# Altium footprint library HamedLib.PcbLib: 221 footprints (part 10 of 14)
Each footprint in its own frame and in the unit in brackets; x right, y up, seen from the top. Pads: shape width x height; smd on the part's side, far side on the other; paste and mask are expansions set on the pad; w line width, h text height; cw(c..) or ccw(c..) is an arc to the next point about the centre after c.
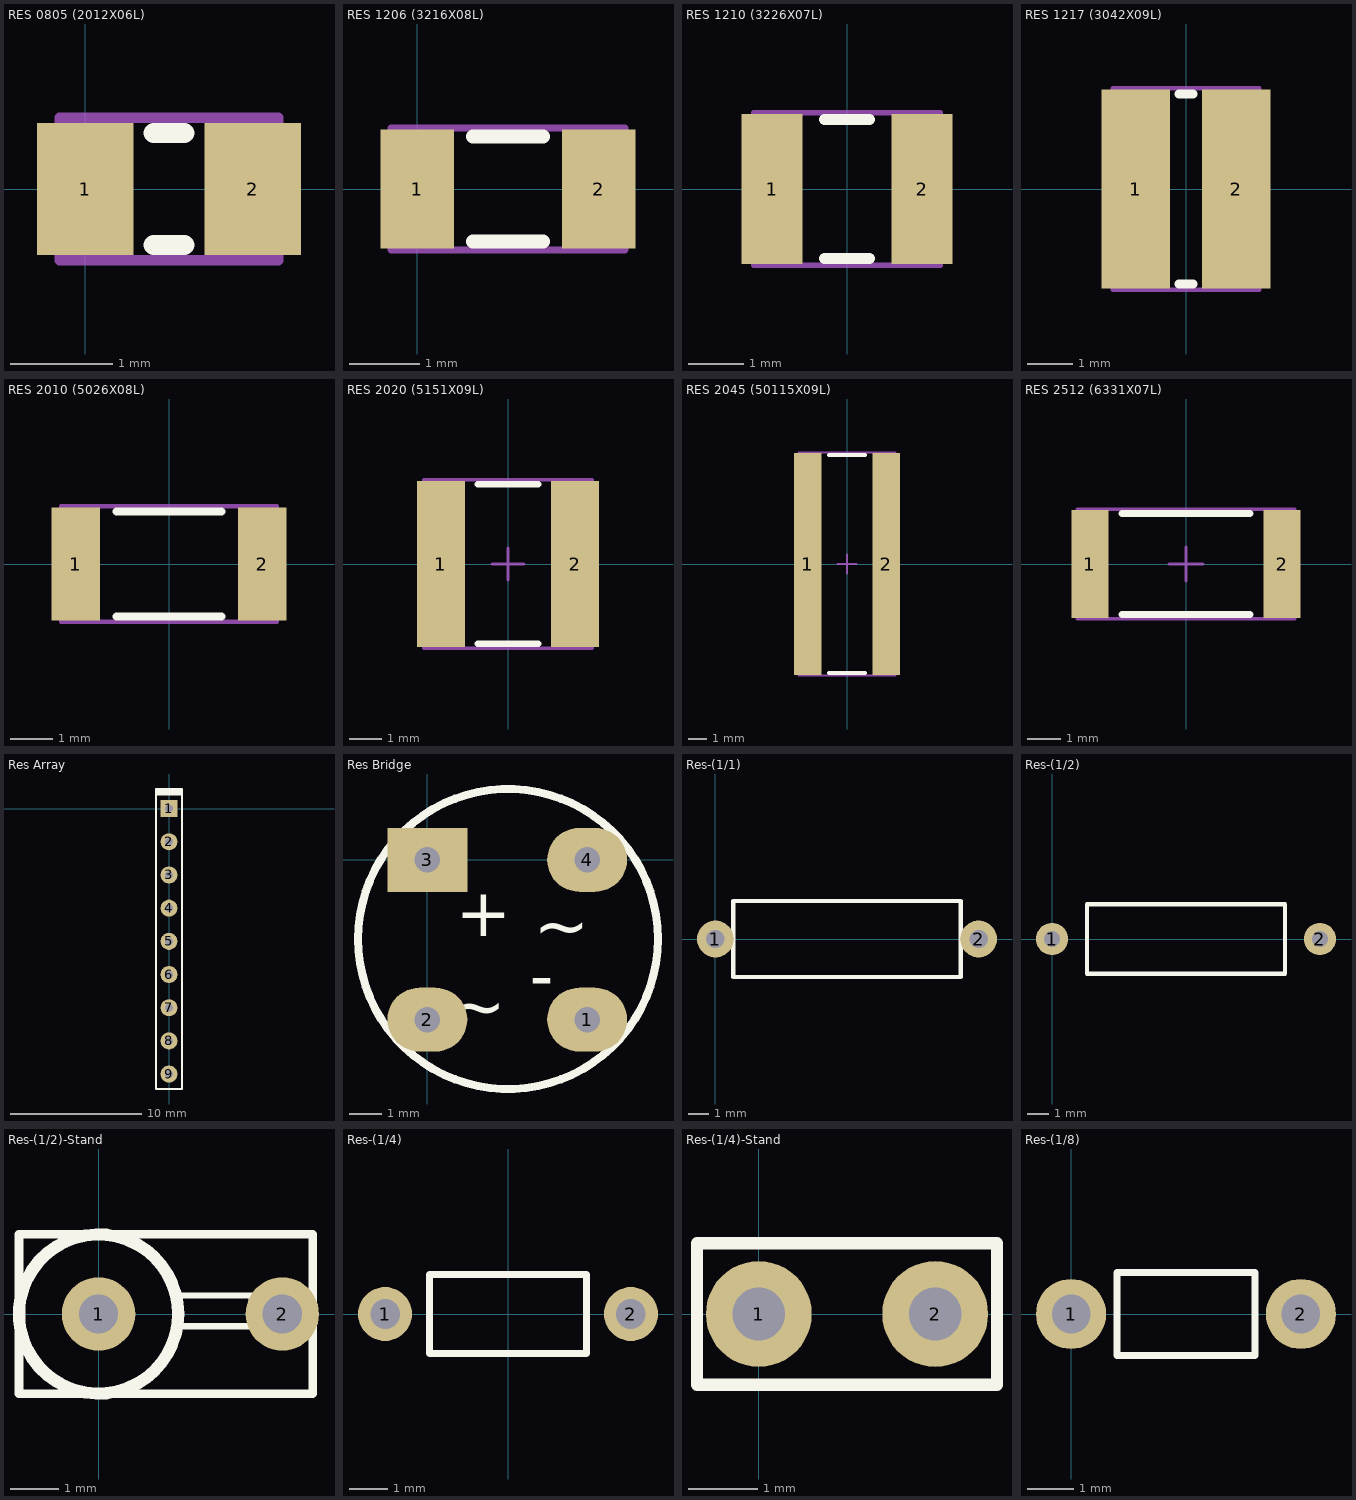
[diagram p9: the footprints below, top view; thin cyan lines are the x and y axes]

## RES 0805 (2012X06L) [mm] "Chip Resistor, 2-Leads, Body 2.0x1.3mm, IPC High Density _ (0.100 W)"
height 0.65
pads (2):
  rect 0.95x1.3 smd: 1(0,0) 2(1.65,0)
Top Overlay:
  lines w0.2: 0.675,-0.55 0.975,-0.55 ; 0.675,0.55 0.975,0.55
Mechanical 13:
  lines w0.1: -0.25,-0.7 -0.25,0.7 1.9,0.7 1.9,-0.7 -0.25,-0.7
3D body "0805.STEP": height 0.6, standoff 0, extent -0.191,-0.635 1.841,0.635

## RES 1206 (3216X08L) [mm] "Chip Resistor, 2-Leads, Body 3.2x1.6mm, IPC High Density _ (0.125 W)"
height 0.75
pads (2):
  rect 1.05x1.7 smd: 1(0,0) 2(2.596,0)
Top Overlay:
  lines w0.2: 0.798,-0.75 1.798,-0.75 ; 0.798,0.75 1.798,0.75
Mechanical 13:
  lines w0.1: -0.377,-0.875 2.973,-0.875 2.973,0.875 -0.377,0.875 -0.377,-0.875
3D body "1206.STEP": height 0.6, standoff 0, extent -0.226,-0.762 2.822,0.762

## RES 1210 (3226X07L) [mm] "Chip Resistor, 2-Leads, Body 3.2x2.6mm, IPC High Density _ (0.250 W)"
height 0.7
pads (2):
  rect 1.1x2.7 smd: 1(-1.35,0) 2(1.35,0)
Top Overlay:
  lines w0.2: -0.4,-1.25 0.4,-1.25 ; -0.4,1.25 0.4,1.25
Mechanical 13:
  lines w0.1: -1.675,-1.375 -1.675,1.375 1.675,1.375 1.675,-1.375 -1.675,-1.375
3D body "1210.STEP": height 0.6, standoff 0, extent -1.524,-1.27 1.524,1.27

## RES 1217 (3042X09L) [mm] "Chip Resistor, 2-Leads, Body 3.0x4.2mm, IPC High Density _ (0.250 W)"
height 0.9
pads (2):
  rect 1.5x4.35 smd: 1(-1.1,0) 2(1.1,0)
Top Overlay:
  lines w0.2: -0.15,-2.075 0.15,-2.075 ; -0.15,2.075 0.15,2.075
Mechanical 13:
  lines w0.1: -1.6,-2.2 -1.6,2.2 1.6,2.2 1.6,-2.2 -1.6,-2.2
3D body "1217.STEP": height 0.9, standoff 0, extent -1.524,-2.159 1.524,2.159

## RES 2010 (5026X08L) [mm] "Chip Resistor, 2-Leads, Body 5.0x2.6mm, IPC High Density _ (0.250 W)"
height 0.8
pads (2):
  rect 1.15x2.7 smd: 1(-2.225,0) 2(2.225,0)
Top Overlay:
  lines w0.2: -1.25,-1.25 1.25,-1.25 ; -1.25,1.25 1.25,1.25
Mechanical 13:
  lines w0.1: -2.575,-1.375 -2.575,1.375 2.575,1.375 2.575,-1.375 -2.575,-1.375
3D body "2010.STEP": height 0.6, standoff 0, extent -2.54,-1.27 2.54,1.27

## RES 2020 (5151X09L) [mm] "Chip Resistor, 2-Leads, Body 5.1x5.1mm, IPC High Density _ (0.5 W)"
height 0.9
pads (2):
  rect 1.5x5.2 smd: 1(-2.1,0) 2(2.1,0)
Top Overlay:
  lines w0.2: -0.95,-2.5 0.95,-2.5 ; -0.95,2.5 0.95,2.5
Mechanical 13:
  lines w0.1: -2.64,-2.64 2.64,-2.64 2.64,2.64 -2.64,2.64 -2.64,-2.64
Mechanical 15:
  lines w0.1: -0.5,0 0.5,0 ; 0,-0.5 0,0.5
3D body "2020.STEP": height 0.9, standoff 0, extent -2.54,-2.54 2.54,2.54

## RES 2045 (50115X09L) [mm] "Chip Resistor, 2-Leads, Body 5.0x11.5mm, IPC High Density _ (1.0 W)"
height 0.9
pads (2):
  rect 1.45x11.75 smd: 1(-2.075,0) 2(2.075,0)
Top Overlay:
  lines w0.2: -0.95,-5.775 0.95,-5.775 ; -0.95,5.775 0.95,5.775
Mechanical 13:
  lines w0.1: -2.575,-5.9 2.575,-5.9 2.575,5.9 -2.575,5.9 -2.575,-5.9
Mechanical 15:
  lines w0.1: -0.5,0 0.5,0 ; 0,-0.5 0,0.5
3D body "2045.STEP": height 0.9, standoff 0, extent -2.54,-5.715 2.54,5.715

## RES 2512 (6331X07L) [mm] "Chip Resistor, 2-Leads, Body 6.3x3.1mm, IPC High Density _ (0.500 W)"
height 0.7
pads (2):
  rect 1.1x3.2 smd: 1(-2.85,0) 2(2.85,0)
Top Overlay:
  lines w0.2: -1.9,-1.5 1.9,-1.5 ; -1.9,1.5 1.9,1.5
Mechanical 13:
  lines w0.1: -3.225,-1.625 3.225,-1.625 3.225,1.625 -3.225,1.625 -3.225,-1.625
Mechanical 15:
  lines w0.1: -0.5,0 0.5,0 ; 0,-0.5 0,0.5
3D body "2512.STEP": height 0.6, standoff 0, extent -3.175,-1.524 3.175,1.524

## Res Array [mm]
pads (9):
  rect 1.3x1.3 hole 0.6: 1(0,0)
  round 1.3 hole 0.6: 2(0,-2.54) 3(0,-5.08) 4(0,-7.62) 5(0,-10.16) 6(0,-12.7) 7(0,-15.24) 8(0,-17.78) 9(0,-20.32)
Top Overlay:
  rectangle: -1,1 1,1.5
  lines w0.178: -1,-21.463 -1,1.5 1,1.5 1,-21.463 -1,-21.463
3D body "SW3dPS-80015102.step": height 5.4, standoff -3.1, extent -0.625,-21.375 0.625,1.125

## Res Bridge [mm]
pads (4):
  oval 2.5x2 hole 0.8: 1(5,-5) 2(0,-5) 4(5,0)
  rect 2.5x2 hole 0.8: 3(0,0)
Top Overlay:
  circle w0.254: c2.523,-2.477 r4.695
  text "~" at 0.711,-5.319 h1.52
  text "~" at 3.327,-2.794 h1.52
  text "-" at 3.2,-4.369 h1.52
  text "+" at 0.889,-2.388 h1.52

## Res-(1/1) [mil]
pads (2):
  round 70 hole 35: 1(0,0) 2(500,0)
Top Overlay:
  lines w7.87: 34,-72 34,72 466,72 466,-72 34,-72
3D body "Res_Normal (1W).STEP": height 150.74, standoff -78.74, extent -10.5,-71 514.5,73

## Res-(1/2) [mil]
pads (2):
  round 60 hole 30: 1(0,0) 2(500,0)
Top Overlay:
  lines w7.87: 65,-65 65,65 435,65 435,-65 65,-65
3D body: height 135.48, standoff 4, extent 365,-66 395,65.74
3D body: height 135.48, standoff 4, extent 162.5,-66 192.5,65.74
3D body: height 135.48, standoff 4, extent 100,-66 130,65.74
3D body: height 135.48, standoff 4, extent 225,-66 255,65.74
3D body: height 134.49, standoff 5, extent 65,-65 435,64.74
3D body: height 70, standoff -80, extent -12.4,-12.47 12.5,12.48
3D body: height 82.4, standoff 57.5, extent 0,-12.48 500,12.48
3D body: height 82.5, standoff 57.5, extent -12.37,-12.44 12.5,12.45
3D body: height 70, standoff -80, extent 487.6,-12.47 512.5,12.48
3D body: height 82.5, standoff 57.5, extent 487.63,-12.44 512.5,12.45

## Res-(1/2)-Stand [mil]
pads (2):
  round 60 hole 32: 1(0,0) 2(150,0)
Top Overlay:
  circle w10: c0,0 r65
  lines w5: 65,-10 125,-10 125,15 65,15
  lines w7: -65,-65 175,-65 175,65 -65,65 -65,-65
3D body: height 433, standoff 407, extent -12.86,-12.94 13,12.95
3D body: height 420, standoff -80, extent 137.11,-12.97 163.01,12.98
3D body: height 432.9, standoff 407, extent 0,-12.97 150,12.97
3D body: height 380, standoff 20, extent -64.48,-64.87 65,64.87
3D body: height 420, standoff -80, extent -12.89,-12.97 13,12.98
3D body: height 433, standoff 407, extent 137.14,-12.95 163,12.94
3D body: height 80, standoff 50, extent -65.48,-65.87 66,65.87
3D body: height 130, standoff 100, extent -65.48,-65.87 66,65.87
3D body: height 180, standoff 150, extent -65.48,-65.87 66,65.87
3D body: height 350, standoff 320, extent -65.48,-65.87 66,65.87

## Res-(1/4) [mil]
pads (2):
  round 55 hole 30: 1(-125,0) 2(125,0)
Top Overlay:
  lines w7.09: -80,-40 -80,40 80,40 80,-40 -80,-40
3D body "Res_Normal (0.25W).STEP": height 115.05, standoff -39.37, extent -135,-36.48 135,36

## Res-(1/4)-Stand [mil]
pads (2):
  round 60 hole 30: 1(0,0) 2(100,0)
Top Overlay:
  lines w7: -35,-40 -35,40 135,40 135,-40 -35,-40
3D body "Res 0.25W_Stand.STEP": height 287.32, standoff -57.17, extent -35.08,-35.48 111.08,37

## Res-(1/8) [mil]
pads (2):
  round 60 hole 33: 1(0,0) 2(196.85,0)
Top Overlay:
  lines w5.91: 39.37,-35.43 39.37,35.43 157.48,35.43 157.48,-35.43 39.37,-35.43
3D body "Res_18.STEP": height 76.63, standoff -32.9, extent -9.84,-31.5 206.69,29.14